# Altium footprint library Remote.PcbLib: 47 footprints (part 2 of 3)
Each footprint in its own frame and in the unit in brackets; x right, y up, seen from the top. Pads: shape width x height; smd on the part's side, far side on the other; paste and mask are expansions set on the pad; w line width, h text height; cw(c..) or ccw(c..) is an arc to the next point about the centre after c.
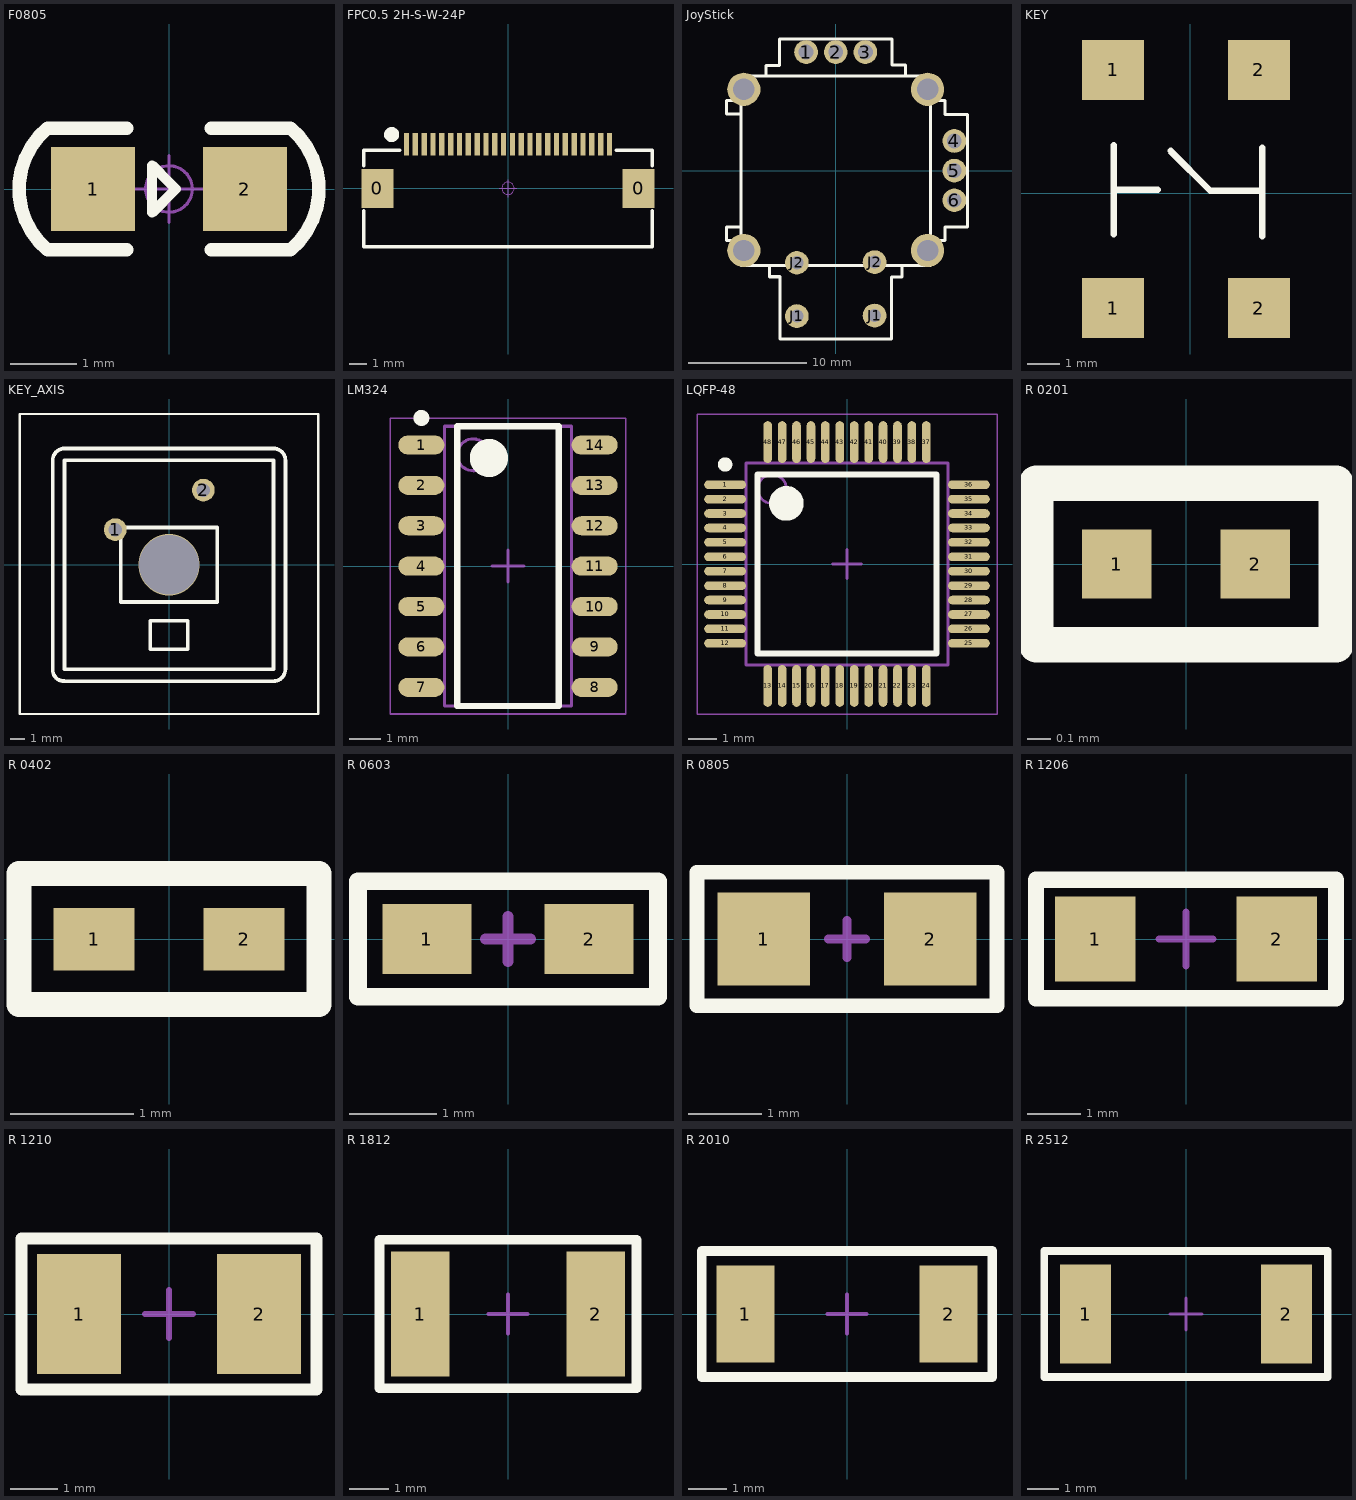
[diagram p1: the footprints below, top view; thin cyan lines are the x and y axes]

## F0805 [mil] "自恢复保险丝"
height 19.68
pads (2):
  rect 50x50 smd: 1(-45,0) 2(45,0)
Top Overlay:
  lines w6: -10,-14 4,0 0.5,3.5 -10,14 -10,-14
  lines w7.87: -25,-36 -72,-36 cw(c-42,0) -72,36 -25,36 ; 25,-36 72,-36 ccw(c42,0) 72,36 25,36
Mechanical 15:
  circle w1.97: c0,0 r13.78
  lines w1.97: -19.68,0 19.68,0 ; 0,-19.68 0,19.68
3D body "C 0805.STEP": height 20.08, standoff -0.39, extent -39.37,-24.02 39.37,24.02

## FPC0.5 2H-S-W-24P [mm] "长：16.2mm，宽：5.2mm，高：2mm"
pads (26):
  rect 1.8x2.2 smd: 0(-7.4,0) 0(7.4,0)
  rect 0.3x1.3 smd: 1(-5.75,2.497) 2(-5.25,2.497) 3(-4.75,2.497) 4(-4.25,2.497) 5(-3.75,2.497) 6(-3.25,2.497) 7(-2.75,2.497) 8(-2.25,2.497) 9(-1.75,2.497) 10(-1.25,2.497) 11(-0.75,2.497) 12(-0.25,2.497) 13(0.25,2.497) 14(0.75,2.497) 15(1.25,2.497) 16(1.75,2.497) 17(2.25,2.497) 18(2.75,2.497) 19(3.25,2.497) 20(3.75,2.497) 21(4.25,2.497) 22(4.75,2.497) 23(5.25,2.497) 24(5.75,2.497)
Top Overlay:
  circle w0.5: c-6.594,3.048 r0.18
  lines w0.2: -8.175,-1.27 -8.175,-3.302 8.175,-3.302 8.175,-1.27 ; -8.175,1.27 -8.175,2.159 -6.143,2.159 ; 6.143,2.159 8.175,2.159 8.175,1.27
Mechanical 15:
  circle w0.05: c0,0 r0.35
  lines w0.05: -0.5,0 0.5,0 ; 0,-0.5 0,0.5
3D body "FPC0.5 2H-S-W-24P.STEP": height 2, standoff -0.01, extent -8.1,-3.15 8.1,2.85

## JoyStick [mm]
pads (14):
  round 2 hole 1.25: 1(-2.5,10) 2(0,10) 3(2.5,10) 4(10,2.5) 5(10,0) 6(10,-2.5)
  round 2 hole 1.1: J1(-3.277,-12.268) J1(3.274,-12.222) J2(-3.277,-7.768) J2(3.274,-7.722)
  round 2.8 hole 1.8: ""(-7.753,-6.731) ""(-7.753,6.858) ""(7.747,-6.731) ""(7.747,6.858)
Top Overlay:
  lines w0.254: -9.2,-5.899 -9.2,-4.76 -8.122,-4.76 ; -9.2,5.899 -9.2,4.76 -8.061,4.76 ; -9.143,-5.899 -8.001,-5.899 ; -9.143,5.899 -8.001,5.899 ; -5.899,8.001 -5.899,8.88 ; -5.6,-8.013 -5.6,-8.95 -4.701,-8.95 ; -4.75,8.88 -4.75,11.1 4.75,11.1 4.75,8.893 ; -4.7,-8.951 -4.7,-14.2 0,-14.2 4.7,-14.2 4.7,-8.951 5.599,-8.951 ; 4.753,8.893 5.899,8.893 5.899,8.001 ; 5.6,-8.95 5.6,-8.012 ; 8.001,-5.899 9.2,-5.899 9.2,-4.75 11.1,-4.75 11.1,4.75 9.2,4.75 9.2,5.899 8.057,5.899 ; -5.899,8.88 -4.76,8.88 -5.899,8.88 ; -8,-8 8,-8 8,8 -8,8 -8,-8
3D body: height 0.25, standoff 0, extent -4.699,-14.097 -4.699,-14.097
3D body: height 0.25, standoff 0, extent -9.398,-14.351 11.176,11.176

## KEY [mm]
pads (4):
  rect 1.9x1.85 smd: 1(-2.377,-3.548) 1(-2.377,3.802) 2(2.123,-3.548) 2(2.123,3.802)
Top Overlay:
  lines w0.2: -2.352,-1.273 -2.352,1.477 ; -2.352,0.102 -1.002,0.102 ; -0.602,1.302 0.623,0.077 2.223,0.077 ; 2.223,-1.323 2.223,1.402
3D body: height 0.25, standoff 0, extent -3.429,-4.572 3.175,4.826

## KEY_AXIS [mm]
pads (2):
  round 1.524 hole 0.9: 1(-3.6,2.35) 2(2.3,5)
via 0,0 diameter 4.1 hole 4
Top Overlay:
  lines w0.152: -10,0 -10,-10 0,-10 10,-10 10,0 ; -10,0.102 -10,10.102 0,10.102 10,10.102 10,0.102
  lines w0.254: -7.794,-7.041 -7.794,-5.799 -7.795,5.784 -7.795,6.985 ; -7.794,-7.028 ccw(c-7.04,-7.041) -7.026,-7.795 ; -7.794,6.97 cw(c-6.985,6.985) -6.97,7.794 ; -7.016,-7.805 -5.794,-7.805 5.798,-7.805 ; -6.985,7.795 -5.794,7.795 5.82,7.795 ; 5.791,7.798 6.993,7.798 ; 5.798,-7.802 6.988,-7.802 ; 6.974,-7.802 ccw(c6.988,-6.993) 7.798,-6.977 ; 6.977,7.798 cw(c6.993,6.988) 7.802,6.974 ; 7.798,-6.993 7.798,-5.791 ; 7.802,5.798 7.802,6.988 ; 7.805,-5.791 7.805,5.784 ; -7,-7 -7,0 -7,7 0,7 7,7 7,0 7,-7 0,-7 -7,-7 ; -3.24,-2.5 0,-2.5 3.24,-2.5 3.24,0 3.24,2.5 0,2.5 -3.24,2.5 -3.24,0 -3.24,-2.5 ; -1.25,-5.66 -1.25,-3.745 0,-3.745 1.25,-3.745 1.25,-5.66 0,-5.66 -1.25,-5.66
3D body: height 0.25, standoff 0, extent -6.985,7.747 -6.985,7.747
3D body: height 0.25, standoff 0, extent -7.874,7.874 -7.874,7.874
3D body: height 0.25, standoff 0, extent -7.874,-7.874 7.874,7.874
3D body: height 0.25, standoff 0, extent -1.397,-7.874 1.397,-5.779

## LM324 [mm] "SOIC, 14-Leads, Body 8.65x3.90mm, Pitch 1.27mm, IPC Medium Density"
height 1.75
pads (14):
  oval 1.45x0.6 smd: 1(-2.725,3.81) 2(-2.725,2.54) 3(-2.725,1.27) 4(-2.725,0) 5(-2.725,-1.27) 6(-2.725,-2.54) 7(-2.725,-3.81) 8(2.725,-3.81) 9(2.725,-2.54) 10(2.725,-1.27) 11(2.725,0) 12(2.725,1.27) 13(2.725,2.54) 14(2.725,3.81)
Top Overlay:
  circle w0.25: c-2.725,4.66 r0.125
  circle w0.6: c-0.6,3.4 r0.3
  lines w0.2: -1.6,-4.4 -1.6,4.4 1.6,4.4 1.6,-4.4 -1.6,-4.4
Top Assembly:
  circle w0.1: c-1.1,3.5 r0.5
  lines w0.1: -2,-4.4 -2,4.4 2,4.4 2,-4.4 -2,-4.4
Top Courtyard:
  lines w0.05: -3.7,-4.65 -3.7,4.65 3.7,4.65 3.7,-4.65 -3.7,-4.65
  lines w0.1: -0.5,0 0.5,0 ; 0,-0.5 0,0.5
3D body: height 1.75, standoff 0.1, extent -2,-4.4 2,4.4

## LQFP-48 [mm] "TSQFP, 48-Leads, Body 7.00x7.00mm, Pitch 0.50mm, IPC Medium Density"
height 1.6
pads (48):
  oval 1.45x0.3 smd: 1(-4.225,2.75) 2(-4.225,2.25) 3(-4.225,1.75) 4(-4.225,1.25) 5(-4.225,0.75) 6(-4.225,0.25) 7(-4.225,-0.25) 8(-4.225,-0.75) 9(-4.225,-1.25) 10(-4.225,-1.75) 11(-4.225,-2.25) 12(-4.225,-2.75) 25(4.225,-2.75) 26(4.225,-2.25) 27(4.225,-1.75) 28(4.225,-1.25) 29(4.225,-0.75) 30(4.225,-0.25) 31(4.225,0.25) 32(4.225,0.75) 33(4.225,1.25) 34(4.225,1.75) 35(4.225,2.25) 36(4.225,2.75)
  oval 0.3x1.45 smd: 13(-2.75,-4.225) 14(-2.25,-4.225) 15(-1.75,-4.225) 16(-1.25,-4.225) 17(-0.75,-4.225) 18(-0.25,-4.225) 19(0.25,-4.225) 20(0.75,-4.225) 21(1.25,-4.225) 22(1.75,-4.225) 23(2.25,-4.225) 24(2.75,-4.225) 37(2.75,4.225) 38(2.25,4.225) 39(1.75,4.225) 40(1.25,4.225) 41(0.75,4.225) 42(0.25,4.225) 43(-0.25,4.225) 44(-0.75,4.225) 45(-1.25,4.225) 46(-1.75,4.225) 47(-2.25,4.225) 48(-2.75,4.225)
Top Overlay:
  circle w0.6: c-2.1,2.1 r0.3
  circle w0.25: c-4.225,3.45 r0.125
  lines w0.2: -3.1,-3.1 3.1,-3.1 3.1,3.1 -3.1,3.1 -3.1,-3.1
Top Assembly:
  circle w0.1: c-2.6,2.6 r0.5
  lines w0.1: -3.5,-3.5 3.5,-3.5 3.5,3.5 -3.5,3.5 -3.5,-3.5
Top Courtyard:
  lines w0.05: -5.2,-5.2 5.2,-5.2 5.2,5.2 -5.2,5.2 -5.2,-5.2
  lines w0.1: -0.5,0 0.5,0 ; 0,-0.5 0,0.5
3D body: height 1.6, standoff 0.15, extent -3.5,-3.5 3.5,3.5

## R 0201 [mm] "1/20W贴片电阻"
pads (2):
  rect 0.3x0.3 smd: 1(-0.3,0) 2(0.3,0)
Top Overlay:
  lines w0.152: -0.65,-0.35 0.65,-0.35 0.65,0.35 -0.65,0.35 -0.65,-0.35
3D body "R 0201.STEP": height 0.23, standoff 0, extent -0.3,-0.15 0.3,0.15

## R 0402 [mil] "1/16W贴片电阻"
pads (2):
  rect 26x20 smd: 1(-24,0) 2(24,0)
Top Overlay:
  lines w8: -48,-21 48,-21 48,21 -48,21 -48,-21
3D body "R 0402.STEP": height 11.85, standoff -0.09, extent -19.68,-9.84 19.69,9.85

## R 0603 [mil] "1/10W贴片电阻"
pads (2):
  rect 40x31.5 smd: 1(-36.5,0) 2(36.5,0)
Top Overlay:
  lines w8: -67.5,-26 -67.5,26 67.5,26 67.5,-26 -67.5,-26
Mechanical 15:
  lines w5: -10,0 10,0 ; 0,-10 0,10
3D body "R 0603.STEP": height 15.79, standoff -0.13, extent -31.49,-15.74 31.5,15.75

## R 0805 [mil] "1/8W贴片电阻"
pads (2):
  rect 50x50 smd: 1(-45,0) 2(45,0)
Top Overlay:
  lines w8: -81,-36 81,-36 81,36 -81,36 -81,-36
Mechanical 15:
  lines w5: -10,0 10,0 ; 0,-10 0,10
3D body "R 0805.STEP": height 19.72, standoff -0.24, extent -39.37,-24.6 39.37,24.61

## R 1206 [mil] "1/4W贴片电阻"
pads (2):
  rect 60x62.99 smd: 1(-67.5,0) 2(67.5,0)
Top Overlay:
  lines w12: -111.5,-44 -111.5,44 111.5,44 111.5,-44 -111.5,-44
Mechanical 15:
  lines w5: -20,0 20,0 ; 0,-20 0,20
3D body "R 1206.STEP": height 21.69, standoff -0.24, extent -62.99,-31.49 63,31.5

## R 1210 [mil] "1/3W贴片电阻"
pads (2):
  rect 70x100 smd: 1(-75,0) 2(75,0)
Top Overlay:
  lines w10: -123,-63 123,-63 123,63 -123,63 -123,-63
Mechanical 15:
  lines w5: -20,0 20,0 ; 0,-20 0,20
3D body "R 1210.STEP": height 21.69, standoff -0.32, extent -62.99,-49.2 63,49.22

## R 1812 [mm] "1/2W贴片电阻"
pads (2):
  rect 1.5x3.2 smd: 1(-2.25,0) 2(2.25,0)
Top Overlay:
  lines w0.254: -1.27,1.905 1.016,1.905 3.302,1.905 3.302,-0.508 3.302,-1.905 1.016,-1.905 -1.016,-1.905 -3.302,-1.905 -3.302,1.905 -1.016,1.905
Mechanical 15:
  lines w0.1: -0.508,0 0.508,0 ; 0,-0.508 0,0.508
3D body "R 1812.STEP": height 0.55, standoff -0.01, extent -2.25,-1.6 2.25,1.6

## R 2010 [mm] "3/4W贴片电阻"
pads (2):
  rect 1.52x2.54 smd: 1(-2.665,0) 2(2.665,0)
Top Overlay:
  lines w0.254: -3.81,-1.651 1.27,-1.651 3.81,-1.651 3.81,-0.635 3.81,1.651 1.27,1.651 -3.81,1.651 -3.81,0.635 -3.81,-1.651
Mechanical 15:
  lines w0.1: -0.508,0 0.508,0 ; 0,-0.508 0,0.508
3D body "R 2010.STEP": height 0.55, standoff -0.01, extent -2.5,-1.25 2.5,1.25

## R 2512 [mm] "1W贴片电阻"
pads (2):
  rect 1.65x3.2 smd: 1(-3.24,0) 2(3.24,0)
Top Overlay:
  lines w0.254: -4.572,-2.032 -4.572,2.032 4.572,2.032 4.572,-2.032 -4.572,-2.032
Mechanical 15:
  lines w0.1: -0.508,0 0.508,0 ; 0,-0.508 0,0.508
3D body "R 2512.STEP": height 0.55, standoff -0.02, extent -3.2,-1.6 3.2,1.6